# Altium footprint library bs_libs.PcbLib: 95 footprints (part 2 of 6)
Each footprint in its own frame and in the unit in brackets; x right, y up, seen from the top. Pads: shape width x height; smd on the part's side, far side on the other; paste and mask are expansions set on the pad; w line width, h text height; cw(c..) or ccw(c..) is an arc to the next point about the centre after c.
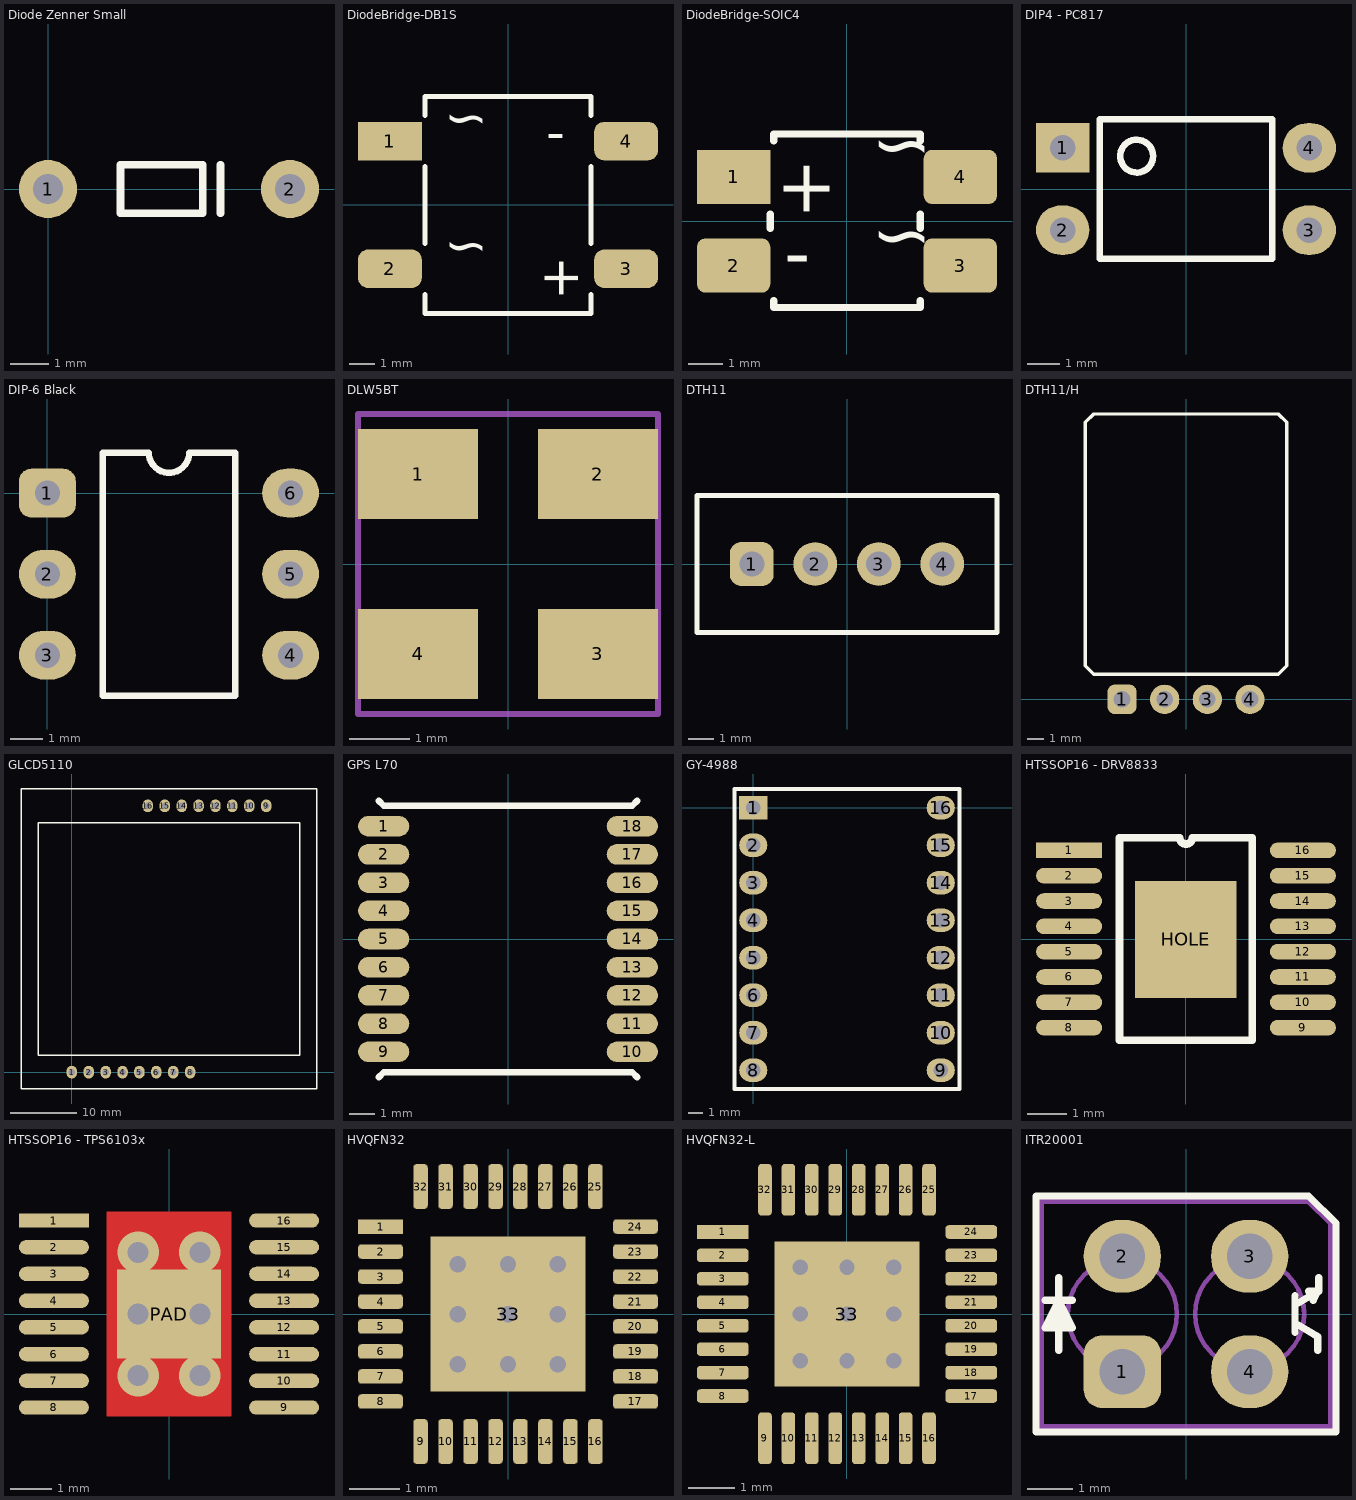
[diagram p1: the footprints below, top view; thin cyan lines are the x and y axes]

## Diode Zenner Small [mil]
pads (2):
  round 60 hole 31: 1(0,0) 2(250,0)
Top Overlay:
  lines w8: 178.33,-25 178.33,25 ; 75,-25 75,25 160,25 160,0 160,-25 75,-25

## DiodeBridge-DB1S [mil]
pads (4):
  rect 100x60 smd: 1(-185,100)
  rrect50% 100x60 smd: 2(-185,-100) 3(185,-100) 4(185,100)
Top Overlay:
  lines w8: -130,-140 -130,-170 130,-170 130,-140 ; -130,-60 -130,60 ; -130,140 -130,170 130,170 130,140 ; 130,-60 130,60
  text "+" at 110,-80 h60
  text "-" at 60,130 h60
  text "~" at -100,-40 h60
  text "~" at -100,160 h60
3D body "User Library-SDIP-Diode bridge.step": height 142.91, standoff 0, extent -195.85,-167 197.85,167.65

## DiodeBridge-SOIC4 [mm]
pads (4):
  rect 2.1x1.55 smd: 1(-3.25,1.27)
  rrect30% 2.1x1.55 smd: 2(-3.25,-1.27) 3(3.25,-1.27) 4(3.25,1.27)
Top Overlay:
  lines w0.203: -2.2,-0.2 -2.2,0.2 ; -2.1,-2.275 -2.1,-2.475 2.1,-2.475 2.1,-2.275 ; -2.1,2.3 -2.1,2.5 2.1,2.5 2.1,2.3 ; 2.1,-0.2 2.1,0.2
  text "+" at -0.5,1.8 h1.52
  text "-" at -1.8,-0.5 h1.52
  text "~" at 0.7,0.2 h1.52
  text "~" at 0.7,2.8 h1.52
3D body "User Library-Bridge SMD TO-269AA MB6S.step": height 2.91, standoff 0, extent -3.52,-2.475 3.52,2.475

## DIP4 - PC817 [mil]
pads (4):
  rect 65x60 hole 31: 1(-150,50)
  oval 65x60 hole 31: 2(-150,-50) 3(150,-50) 4(150,50)
Top Overlay:
  circle w8: c-60,40 r20
  lines w8: -105,-85 105,-85 105,85 -105,85 -105,-85
3D body "User Library-DIP4-7_62-2_54.step": height 169.29, standoff -106.3, extent -155.12,-90.36 155.12,90.37

## DIP-6 Black [mil]
pads (6):
  rrect50% 70x60 hole 31: 1(0,0)
  oval 70x60 hole 31: 2(0,-100) 3(0,-200) 4(300,-200) 5(300,-100) 6(300,0)
Top Overlay:
  lines w8: 68,-250 232,-250 232,50 175,50 cw(c150,50) 125,50 68,50 68,-250
3D body "CircuitWorks-DIP6.step": height 169.69, standoff -129.13, extent -7.48,-258.11 307.48,60

## DLW5BT [mm]
pads (4):
  rect 2x1.5 smd: 1(-1.5,1.5) 2(1.5,1.5) 3(1.5,-1.5) 4(-1.5,-1.5)
Mechanical 1:
  lines w0.1: -2.5,-2.5 2.5,-2.5 2.5,2.5 -2.5,2.5 -2.5,-2.5
3D body: height 2.8, standoff 0, extent -2.5,-2.5 2.5,2.5

## DTH11 [mm] "Temperature and humidity module"
pads (4):
  rrect50% 1.75x1.75 hole 1: 1(-3.81,0)
  round 1.75 hole 1: 2(-1.27,0) 3(1.27,0) 4(3.81,0)
Top Overlay:
  lines w0.2: -6,-2.75 -6,2.75 6,2.75 6,-2.75 -6,-2.75
3D body "User Library-DHT11.step": height 15.75, standoff -7.75, extent -6,-2.75 6,2.75

## DTH11/H [mm] "Temperature and humidity module"
pads (4):
  rrect50% 1.75x1.75 hole 1: 1(-3.81,0)
  round 1.75 hole 1: 2(-1.27,0) 3(1.27,0) 4(3.81,0)
Top Overlay:
  lines w0.2: -6,2 -5.5,1.5 5.5,1.5 6,2 6,16.5 5.5,17 -5.5,17 -6,16.5 -6,2
3D body "User Library-DHT11.step": height 5.5, standoff 0, extent -6,-6.5 6,17

## GLCD5110 [mil]
pads (16):
  oval 62x75 hole 39: 1(0,0) 2(100,0) 3(200,0) 4(300,0) 5(400,0) 6(500,0) 7(600,0) 8(700,0) 9(1150,1575) 10(1050,1575) 11(950,1575) 12(850,1575) 13(750,1575) 14(650,1575) 15(550,1575) 16(450,1575)
Top Overlay:
  lines w8: -300,-100 1450,-100 1450,1675 -300,1675 -300,-100 ; -200,100 -200,1475 1350,1475 1350,100 -200,100

## GPS L70 [mm]
pads (18):
  oval 2x0.8 smd: 1(-4.85,4.4) 2(-4.85,3.3) 3(-4.85,2.2) 4(-4.85,1.1) 5(-4.85,0) 6(-4.85,-1.1) 7(-4.85,-2.2) 8(-4.85,-3.3) 9(-4.85,-4.4) 10(4.85,-4.4) 11(4.85,-3.3) 12(4.85,-2.2) 13(4.85,-1.1) 14(4.85,0) 15(4.85,1.1) 16(4.85,2.2) 17(4.85,3.3) 18(4.85,4.4)
Top Overlay:
  lines w0.254: -5.05,-5.4 -4.85,-5.2 4.85,-5.2 5.05,-5.4 ; -5.05,5.4 -4.85,5.2 4.85,5.2 5.05,5.4
3D body "User Library-QUECTEL L70.step": height 2.52, standoff 0, extent -4.85,-5.05 4.85,5.05

## GY-4988 [mil] "Step motor driver"
height 472.44
pads (16):
  rect 75x62 hole 39: 1(0,0)
  oval 75x62 hole 39: 2(0,-100) 3(0,-200) 4(0,-300) 5(0,-400) 6(0,-500) 7(0,-600) 8(0,-700) 9(500,-700) 10(500,-600) 11(500,-500) 12(500,-400) 13(500,-300) 14(500,-200) 15(500,-100) 16(500,0)
Top Overlay:
  lines w10: -50,-750 550,-750 550,50 -50,50 -50,-750

## HTSSOP16 - DRV8833 [mm]
pads (17):
  rect 1.7x0.4 smd: 1(-3,2.275)
  oval 1.7x0.4 smd: 2(-3,1.625) 3(-3,0.975) 4(-3,0.325) 5(-3,-0.325) 6(-3,-0.975) 7(-3,-1.625) 8(-3,-2.275) 9(3,-2.275) 10(3,-1.625) 11(3,-0.975) 12(3,-0.325) 13(3,0.325) 14(3,0.975) 15(3,1.625) 16(3,2.275)
  rect 2.6x3 smd: HOLE(-0.003,-0.011)
Top Overlay:
  lines w0.2: -1.705,-2.6 1.699,-2.6 1.699,2.6 0.162,2.6 cw(c0,2.6) -0.162,2.6 -1.705,2.6 -1.705,-2.6
3D body "User Library-TSSOP-16-1.step": height 1.1, standoff 0, extent -3.2,-2.5 3.2,2.5

## HTSSOP16 - TPS6103x [mm]
pads (17):
  rect 1.7x0.35 smd: 1(-2.8,2.275)
  oval 1.7x0.35 smd: 2(-2.8,1.625) 3(-2.8,0.975) 4(-2.8,0.325) 5(-2.8,-0.325) 6(-2.8,-0.975) 7(-2.8,-1.625) 8(-2.8,-2.275) 9(2.8,-2.275) 10(2.8,-1.625) 11(2.8,-0.975) 12(2.8,-0.325) 13(2.8,0.325) 14(2.8,0.975) 15(2.8,1.625) 16(2.8,2.275)
  rect 2.54x2.159 smd: PAD(0,0)
via 0.75,1.5 diameter 1.016 hole 0.508
via -0.75,1.5 diameter 1.016 hole 0.508
via 0.75,-1.5 diameter 1.016 hole 0.508
via -0.75,-1.5 diameter 1.016 hole 0.508
via -0.75,0 diameter 1.016 hole 0.508
via 0.75,0 diameter 1.016 hole 0.508
Top Layer:
  rectangle: -1.524,-2.5 1.524,2.5
3D body "User Library-TSSOP-16-1.step": height 1.1, standoff 0, extent -3.197,-2.489 3.203,2.511

## HVQFN32 [mm]
pads (33):
  rect 0.9x0.29 smd: 1(-2.55,1.75)
  rrect50% 0.9x0.29 smd: 2(-2.55,1.25) 3(-2.55,0.75) 4(-2.55,0.25) 5(-2.55,-0.25) 6(-2.55,-0.75) 7(-2.55,-1.25) 8(-2.55,-1.75) 17(2.55,-1.75) 18(2.55,-1.25) 19(2.55,-0.75) 20(2.55,-0.25) 21(2.55,0.25) 22(2.55,0.75) 23(2.55,1.25) 24(2.55,1.75)
  rrect50% 0.29x0.9 smd: 9(-1.75,-2.55) 10(-1.25,-2.55) 11(-0.75,-2.55) 12(-0.25,-2.55) 13(0.25,-2.55) 14(0.75,-2.55) 15(1.25,-2.55) 16(1.75,-2.55) 25(1.75,2.55) 26(1.25,2.55) 27(0.75,2.55) 28(0.25,2.55) 29(-0.25,2.55) 30(-0.75,2.55) 31(-1.25,2.55) 32(-1.75,2.55)
  rect 3.1x3.1 smd: 33(0,0)
via 0,0 diameter 0.66 hole 0.33
via 1,0 diameter 0.66 hole 0.33
via 1,-1 diameter 0.66 hole 0.33
via 0,-1 diameter 0.66 hole 0.33
via -1,-1 diameter 0.66 hole 0.33
via -1,0 diameter 0.66 hole 0.33
via -1,1 diameter 0.66 hole 0.33
via 0,1 diameter 0.66 hole 0.33
via 1,1 diameter 0.66 hole 0.33
3D body "User Library-QFN32 (FTDI).STEP": height 0.8, standoff -0.05, extent -2.5,-2.5 2.5,2.5

## HVQFN32-L [mm]
pads (33):
  rect 1.1x0.29 smd: 1(-2.65,1.75)
  rrect50% 1.1x0.29 smd: 2(-2.65,1.25) 3(-2.65,0.75) 4(-2.65,0.25) 5(-2.65,-0.25) 6(-2.65,-0.75) 7(-2.65,-1.25) 8(-2.65,-1.75) 17(2.65,-1.75) 18(2.65,-1.25) 19(2.65,-0.75) 20(2.65,-0.25) 21(2.65,0.25) 22(2.65,0.75) 23(2.65,1.25) 24(2.65,1.75)
  rrect50% 0.29x1.1 smd: 9(-1.75,-2.65) 10(-1.25,-2.65) 11(-0.75,-2.65) 12(-0.25,-2.65) 13(0.25,-2.65) 14(0.75,-2.65) 15(1.25,-2.65) 16(1.75,-2.65) 25(1.75,2.65) 26(1.25,2.65) 27(0.75,2.65) 28(0.25,2.65) 29(-0.25,2.65) 30(-0.75,2.65) 31(-1.25,2.65) 32(-1.75,2.65)
  rect 3.1x3.1 smd: 33(0,0)
via 1,1 diameter 0.66 hole 0.33
via 0,1 diameter 0.66 hole 0.33
via -1,1 diameter 0.66 hole 0.33
via -1,0 diameter 0.66 hole 0.33
via -1,-1 diameter 0.66 hole 0.33
via 0,-1 diameter 0.66 hole 0.33
via 1,-1 diameter 0.66 hole 0.33
via 1,0 diameter 0.66 hole 0.33
via 0,0 diameter 0.66 hole 0.33
3D body "User Library-QFN32 (FTDI).STEP": height 0.8, standoff -0.05, extent -2.5,-2.5 2.5,2.5

## ITR20001 [mm]
pads (4):
  rrect50% 1.7x1.6 hole 1: 1(-1.4,-1.27)
  oval 1.7x1.6 hole 1: 2(-1.4,1.27) 3(1.4,1.27) 4(1.4,-1.27)
Top Overlay:
  lines w0.152: -3.3,-2.6 -3.3,2.6 2.7,2.6 3.3,2 3.3,-2.6 -3.3,-2.6
  lines w0.16: -3.1,0.3 -2.5,0.3 ; -3,-0.3 -2.8,0 -2.6,-0.3 ; -2.8,-0.8 -2.8,0.8 ; 2.4,-0.4 2.4,0.4 ; 2.4,-0.2 2.9,-0.5 2.9,-0.8 ; 2.4,0.2 2.9,0.5 ; 2.7,0.5 2.9,0.5 ; 2.8,0.3 2.9,0.5 ; 2.92,0.5 2.92,0.8 ; -3.1,-0.3 -2.8,0.3 -2.5,-0.3 -3.1,-0.3
Mechanical 1:
  circle w0.1: c1.4,0 r1.2
  circle w0.1: c-1.4,0 r1.2
  lines w0.152: -3.2,-2.5 3.2,-2.5 3.2,2 2.7,2.5 -3.2,2.5 -3.2,-2.5
3D body: height 4.1, standoff 0, extent -3.2,-2.5 3.2,2.5
3D body: height 6.5, standoff 4.1, extent -2.6,-1.197 -0.2,1.197
3D body: height 6.5, standoff 4.1, extent 0.2,-1.197 2.6,1.197
3D body: height 6.5, standoff 0, extent -3.2,-2.5 3.2,0
3D body: height 6.5, standoff 0, extent -3.2,0 3.2,2.5
3D body: height 1.27, standoff -1.27, extent -1.778,0.87 -1.019,1.63
3D body: height 1.27, standoff -1.27, extent 1.022,0.87 1.781,1.63
3D body: height 1.27, standoff -1.27, extent 1.022,-1.63 1.781,-0.87
3D body: height 1.27, standoff -1.27, extent -1.778,-1.63 -1.019,-0.87